# Altium footprint library User.PcbLib: 317 footprints (part 1 of 20)
Each footprint in its own frame and in the unit in brackets; x right, y up, seen from the top. Pads: shape width x height; smd on the part's side, far side on the other; paste and mask are expansions set on the pad; w line width, h text height; cw(c..) or ccw(c..) is an arc to the next point about the centre after c.
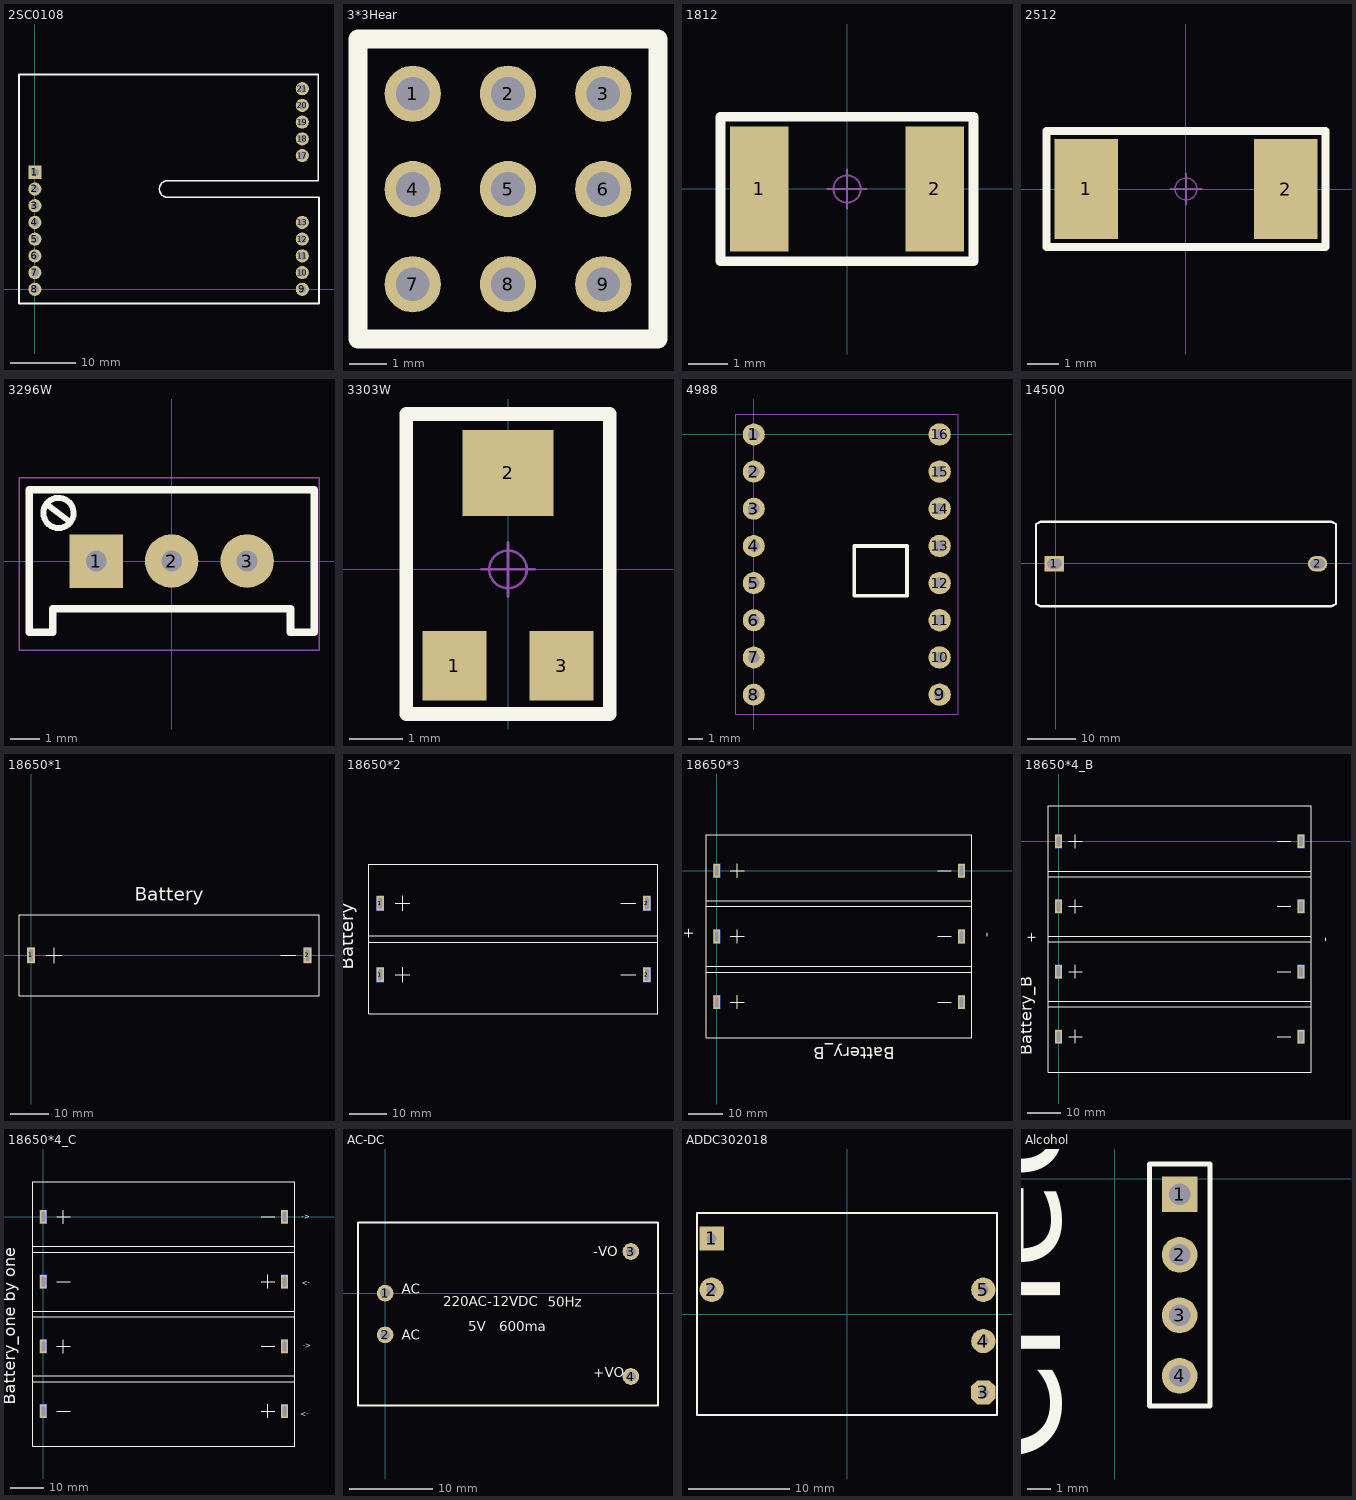
[diagram p0: the footprints below, top view; thin cyan lines are the x and y axes]

## 2SC0108 [mm] "45mm*34.29mm*16mm(长*宽*高)"
pads (18):
  rect 2x2 hole 1.2: 1(0,17.78)
  round 2 hole 1.2: 2(0,15.24) 3(0,12.7) 4(0,10.16) 5(0,7.62) 6(0,5.08) 7(0,2.54) 8(0,0) 9(40.64,0) 10(40.64,2.54) 11(40.64,5.08) 12(40.64,7.62) 13(40.64,10.16) 17(40.64,20.32) 18(40.64,22.86) 19(40.64,25.4) 20(40.64,27.94) 21(40.64,30.48)
Top Overlay:
  lines w0.254: -2.413,-2.159 43.18,-2.159 43.18,13.97 20.193,13.97 cw(c20.193,15.24) 20.193,16.51 43.053,16.51 43.053,32.639 -2.413,32.639 -2.413,-2.159
3D body "2SC0108.STEP": height 16, standoff -5.93, extent -2.16,-1.9 42.84,32.39

## 3*3Hear [mm]
pads (9):
  round 1.5 hole 0.9: 1(-422.54,41.54) 2(-420,41.54) 3(-417.46,41.54) 4(-422.54,39) 5(-420,39) 6(-417.46,39) 7(-422.54,36.46) 8(-420,36.46) 9(-417.46,36.46)
Top Overlay:
  lines w0.5: -424,35 -424,35.5 -424,43 -420,43 -416,43 -416,35 -424,35

## 1812 [mm]
pads (2):
  rect 1.5x3.2 smd: 1(-2.25,0) 2(2.25,0)
Top Overlay:
  lines w0.254: -3.251,-1.854 -3.251,1.854 -1.27,1.854 3.251,1.854 3.251,-1.854 -1.27,-1.854 -3.251,-1.854
Mechanical 15:
  circle w0.05: c0,0 r0.35
  lines w0.05: -0.5,0 0.5,0 ; 0,-0.5 0,0.5
3D body "R 1812.STEP": height 0.55, standoff -0.01, extent -2.25,-1.6 2.25,1.6

## 2512 [mm] "64mm*32mm"
pads (2):
  rect 2.032x3.2 smd: 1(-3.2,0) 2(3.2,0)
Top Overlay:
  lines w0.254: -4.47,-1.854 4.47,-1.854 4.47,1.854 -4.47,1.854 -4.47,-1.854
Mechanical 15:
  circle w0.05: c0,0 r0.35
  lines w0.05: -0.5,0 0.5,0 ; 0,-0.5 0,0.5
3D body "R 2512.STEP": height 0.55, standoff -0.02, extent -3.2,-1.6 3.2,1.6

## 3296W [mm] "Precise Multi-Winding Adjustable Resistor"
pads (3):
  rect 1.8x1.8 hole 0.7: 1(-2.54,0)
  round 1.8 hole 0.7: 2(0,0) 3(2.54,0)
Top Overlay:
  lines w0.2: -3.302,1.651 ccw(c-3.81,1.618) -3.301,1.608
  lines w0.203: -4.2,1.9 -3.464,1.348
  lines w0.254: -4.8,-2.4 -4.8,2.4 4.8,2.4 4.8,-2.4 4,-2.4 4,-1.6 -4,-1.6 -4,-2.4 -4.8,-2.4
Mechanical 15:
  lines w0.05: -5.14,-3 4.96,-3 4.96,2.8 -5.14,2.8 -5.14,-3
3D body "3296.STEP": height 11.52, standoff -3.48, extent -4.75,-2.4 4.75,2.4

## 3303W [mm] "3.5*3.1*1.5mm"
pads (3):
  rect 1.2x1.3 smd: 1(-1,-1.8) 3(1,-1.8)
  rect 1.7x1.6 smd: 2(0,1.8)
Top Overlay:
  lines w0.254: -1.9,-2.7 -1.9,2.9 1.9,2.9 1.9,-2.7 -1.9,-2.7
Mechanical 15:
  circle w0.05: c0,0 r0.35
  lines w0.05: -0.5,0 0.5,0 ; 0,-0.5 0,0.5
3D body "3303W.STEP": height 1.45, standoff -0.01, extent -1.55,-2.055 1.55,2.05

## 4988 [mil] "MODE"
pads (16):
  round 59.06 hole 30: 1(0,0) 2(0,-100) 3(0,-200) 4(0,-300) 5(0,-400) 6(0,-500) 7(0,-600) 8(0,-700)
  round 60 hole 30: 9(500,-700) 10(500,-600) 11(500,-500) 12(500,-400) 13(500,-300) 14(500,-200) 15(500,-100) 16(500,0)
Top Overlay:
  lines w10: 270,-434 412,-434 412,-300 270,-300 270,-434
Mechanical 1:
  lines w3.15: -48.43,-752.09 -48.43,55 550,55 550,-752.09 -48.43,-752.09
3D body: height 433.07, standoff 0, extent -35,-735 35,35
3D body: height 433.07, standoff 0, extent 465,-735 535,35
3D body: height 511.81, standoff 433.07, extent -48.43,-752.09 550,55

## 14500 [mm]
pads (2):
  rect 4x3.2 hole 2 slot 3 at 2 deg: 1(-0.254,-0.077)
  oval 4x3.2 hole 2 slot 3 at 2 deg: 2(54.146,-0.077)
Top Overlay:
  lines w0.5: -4.054,-8.377 -4.054,8.123 -3.054,8.623 56.946,8.623 57.946,8.123 57.946,-8.377 56.946,-8.877 -3.054,-8.877 -4.054,-8.377
3D body: height 10, standoff 0, extent -4.354,-9.177 58.146,8.923

## 18650*1 [mm]
pads (4):
  rect 2x4 hole 1 slot 3 at 90 deg: 1(-0.009,0) 2(71.873,0)
  rect 2x4 smd far side: 1(-0.009,0) 2(71.873,0)
Top Overlay:
  lines w0.254: 3.991,0 7.991,0 ; 5.991,-2 5.991,2 ; 64.873,0 68.873,0 ; -3.127,-10.5 74.873,-10.5 74.873,10.5 -3.127,10.5 -3.127,-10.5
  text "Battery" at 27,13 h6
3D body "User Library-18650 Full.STEP": height 23.65, standoff -1.83, extent -2.93,-10.298 74.72,10.502

## 18650*2 [mm]
pads (8):
  rect 2x4 hole 1 slot 3 at 90 deg: 1(-184,198.7) 1(-184,218) 2(-112.118,198.7) 2(-112.118,218)
  rect 2x4 smd far side: 1(-184,198.7) 1(-184,218) 2(-112.118,198.7) 2(-112.118,218)
Top Overlay:
  lines w0.254: -180,198.7 -176,198.7 ; -180,218 -176,218 ; -178,196.7 -178,200.7 ; -178,216 -178,220 ; -119.118,198.7 -115.118,198.7 ; -119.118,218 -115.118,218 ; -187.118,188.2 -187.118,209.2 -109.118,209.2 -109.118,188.2 -187.118,188.2 ; -187.118,207.5 -187.118,228.5 -109.118,228.5 -109.118,207.5 -187.118,207.5
  text "Battery" at -190,200 h6
3D body "User Library-18650 Full.STEP": height 25.65, standoff 0.17, extent -186.921,188.402 -109.271,209.202
3D body "User Library-18650 Full.STEP": height 25.65, standoff 0.17, extent -186.921,207.702 -109.271,228.502

## 18650*3 [mm]
pads (12):
  rect 2x4 smd far side: 1(-0.025,-38.625) 1(-0.025,-19.325) 1(-0.025,-0.025) 2(71.857,-38.625) 2(71.857,-19.325) 2(71.857,-0.025)
  rect 2x4 hole 1 slot 3 at 90 deg: 1(-0.025,-38.625) 1(-0.025,-19.325) 1(-0.025,-0.025) 2(71.857,-38.625) 2(71.857,-19.325) 2(71.857,-0.025)
Top Overlay:
  lines w0.254: 3.975,-38.625 7.975,-38.625 ; 3.975,-19.325 7.975,-19.325 ; 3.975,-0.025 7.975,-0.025 ; 5.975,-40.625 5.975,-36.625 ; 5.975,-21.325 5.975,-17.325 ; 5.975,-2.025 5.975,1.975 ; 64.857,-38.625 68.857,-38.625 ; 64.857,-19.325 68.857,-19.325 ; 64.857,-0.025 68.857,-0.025 ; -3.143,-49.125 -3.143,-28.125 74.857,-28.125 74.857,-49.125 -3.143,-49.125 ; -3.143,-29.825 -3.143,-8.825 74.857,-8.825 74.857,-29.825 -3.143,-29.825 ; -3.143,-10.525 -3.143,10.475 74.857,10.475 74.857,-10.525 -3.143,-10.525
  text "Battery_B" at 52.175,-50.625 h6
  text "+" at -5.825,-20.125 h5.08
  text "-" at 77.175,-18.125 h5.08
3D body "User Library-18650 Full.STEP": height 23.65, standoff -1.83, extent -2.946,-48.924 74.704,-28.124
3D body "User Library-18650 Full.STEP": height 23.65, standoff -1.83, extent -2.946,-29.624 74.704,-8.824
3D body "User Library-18650 Full.STEP": height 23.65, standoff -1.83, extent -2.946,-10.324 74.704,10.476

## 18650*4_B [mm]
pads (16):
  rect 2x4 smd far side: 1(0,-57.925) 1(0,-38.625) 1(0,-19.325) 1(0,-0.025) 2(71.882,-57.925) 2(71.882,-38.625) 2(71.882,-19.325) 2(71.882,-0.025)
  rect 2x4 hole 1 slot 3 at 90 deg: 1(0,-57.925) 1(0,-38.625) 1(0,-19.325) 1(0,-0.025) 2(71.882,-57.925) 2(71.882,-38.625) 2(71.882,-19.325) 2(71.882,-0.025)
Top Overlay:
  lines w0.254: 3,-57.925 7,-57.925 ; 3,-38.625 7,-38.625 ; 3,-19.325 7,-19.325 ; 3,-0.025 7,-0.025 ; 5,-59.925 5,-55.925 ; 5,-40.625 5,-36.625 ; 5,-21.325 5,-17.325 ; 5,-2.025 5,1.975 ; 64.882,-57.925 68.882,-57.925 ; 64.882,-38.625 68.882,-38.625 ; 64.882,-19.325 68.882,-19.325 ; 64.882,-0.025 68.882,-0.025 ; -3.118,-68.425 74.882,-68.425 74.882,-47.425 -3.118,-47.425 -3.118,-68.425 ; -3.118,-49.125 74.882,-49.125 74.882,-28.125 -3.118,-28.125 -3.118,-49.125 ; -3.118,-29.825 74.882,-29.825 74.882,-8.825 -3.118,-8.825 -3.118,-29.825 ; -3.118,-10.525 74.882,-10.525 74.882,10.475 -3.118,10.475 -3.118,-10.525
  text "-" at 77.2,-28.425 h5.08
  text "+" at -5.7,-30.225 h5.08
  text "Battery_B" at -6.7,-63.425 h6
3D body "User Library-18650 Full.STEP": height 23.65, standoff -1.83, extent -2.921,-68.224 74.729,-47.424
3D body "User Library-18650 Full.STEP": height 23.65, standoff -1.83, extent -2.921,-48.924 74.729,-28.124
3D body "User Library-18650 Full.STEP": height 23.65, standoff -1.83, extent -2.921,-29.624 74.729,-8.824
3D body "User Library-18650 Full.STEP": height 23.65, standoff -1.83, extent -2.921,-10.324 74.729,10.476

## 18650*4_C [mm]
pads (16):
  rect 2x4 smd far side: 1(0,-57.9) 1(0,-38.6) 1(0,-19.3) 1(0,0) 2(71.882,-57.9) 2(71.882,-38.6) 2(71.882,-19.3) 2(71.882,0)
  rect 2x4 hole 1 slot 3 at 90 deg: 1(0,0) 2(71.882,0) 3(71.882,-19.3) 4(0,-19.3) 5(0,-38.6) 6(71.882,-38.6) 7(71.882,-57.9) 8(0,-57.9)
Top Overlay:
  lines w0.254: 4,-57.9 8,-57.9 ; 4,-38.6 8,-38.6 ; 4,-19.3 8,-19.3 ; 4,0 8,0 ; 6,-40.6 6,-36.6 ; 6,-2 6,2 ; 64.882,-57.9 68.882,-57.9 ; 64.882,-38.6 68.882,-38.6 ; 64.882,-19.3 68.882,-19.3 ; 64.882,0 68.882,0 ; 66.882,-59.9 66.882,-55.9 ; 66.882,-21.3 66.882,-17.3 ; -3.118,-68.4 -3.118,-47.4 74.882,-47.4 74.882,-68.4 -3.118,-68.4 ; -3.118,-49.1 -3.118,-28.1 74.882,-28.1 74.882,-49.1 -3.118,-49.1 ; -3.118,-29.8 -3.118,-8.8 74.882,-8.8 74.882,-29.8 -3.118,-29.8 ; -3.118,-10.5 -3.118,10.5 74.882,10.5 74.882,-10.5 -3.118,-10.5
  text "Battery_one by one" at -7.25,-56 h6
  text "->" at 79.6,-18.625 h2.54
  text "->" at 79.05,-57.65 h2.54
  text "->" at 77.25,-39.65 h2.54
  text "->" at 76.975,-1.175 h2.54
3D body "User Library-18650 Full.STEP": height 23.65, standoff -1.83, extent -2.921,-68.198 74.729,-47.398
3D body "User Library-18650 Full.STEP": height 23.65, standoff -1.83, extent -2.921,-48.898 74.729,-28.098
3D body "User Library-18650 Full.STEP": height 23.65, standoff -1.83, extent -2.921,-29.598 74.729,-8.798
3D body "User Library-18650 Full.STEP": height 23.65, standoff -1.83, extent -2.921,-10.298 74.729,10.502

## AC-DC [mm]
pads (4):
  round 2 hole 1.2: 1(0,0) 2(0,-5) 3(29.5,5) 4(29.5,-10)
Top Overlay:
  lines w0.254: -3.25,-13.5 -3.25,8.5 32.75,8.5 32.75,-13.5 -3.25,-13.5
  text "-VO" at 25,3.985 h2.03
  text "+VO" at 25,-10.515 h2.03
  text "AC" at 2,-6.015 h2.03
  text "AC" at 2,-0.515 h2.03
  text "220AC-12VDC" at 7,-2.015 h2.03
  text "5V   600ma" at 10,-5.015 h2.03
  text "50Hz" at 19.5,-2.03 h2.03
3D body: height 15, standoff 1, extent -3,-13 32.5,8

## ADDC302018 [mm] "长宽高30*20*18（mm）"
pads (5):
  rect 2.4x2.4 hole 1: 1(-13.4,7.48)
  round 2.4 hole 1: 2(-13.4,2.4) 4(13.5,-2.68) 5(13.5,2.4)
  oct 2.4x2.4 hole 1: 3(13.5,-7.76)
Top Overlay:
  lines w0.203: -14.85,-10 14.85,-10 14.85,10 -14.85,10 -14.85,-10

## Alcohol [mm]
pads (4):
  rect 1.5x1.5 hole 0.9: 1(2.732,-0.645)
  round 1.5 hole 0.9: 2(2.732,-3.185) 3(2.732,-5.725) 4(2.732,-8.265)
Top Overlay:
  lines w0.2: 1.462,-9.535 4.002,-9.535 4.002,0.625 1.462,0.625 1.462,-9.535
  text "Check" at -0.813,-11.963 h7.62
3D body: height 12, standoff 5, extent 1.287,-13.832 12.504,5.168